# Altium footprint library CeleronLib_THD.PcbLib: 217 footprints (part 6 of 14)
Each footprint in its own frame and in the unit in brackets; x right, y up, seen from the top. Pads: shape width x height; smd on the part's side, far side on the other; paste and mask are expansions set on the pad; w line width, h text height; cw(c..) or ccw(c..) is an arc to the next point about the centre after c.
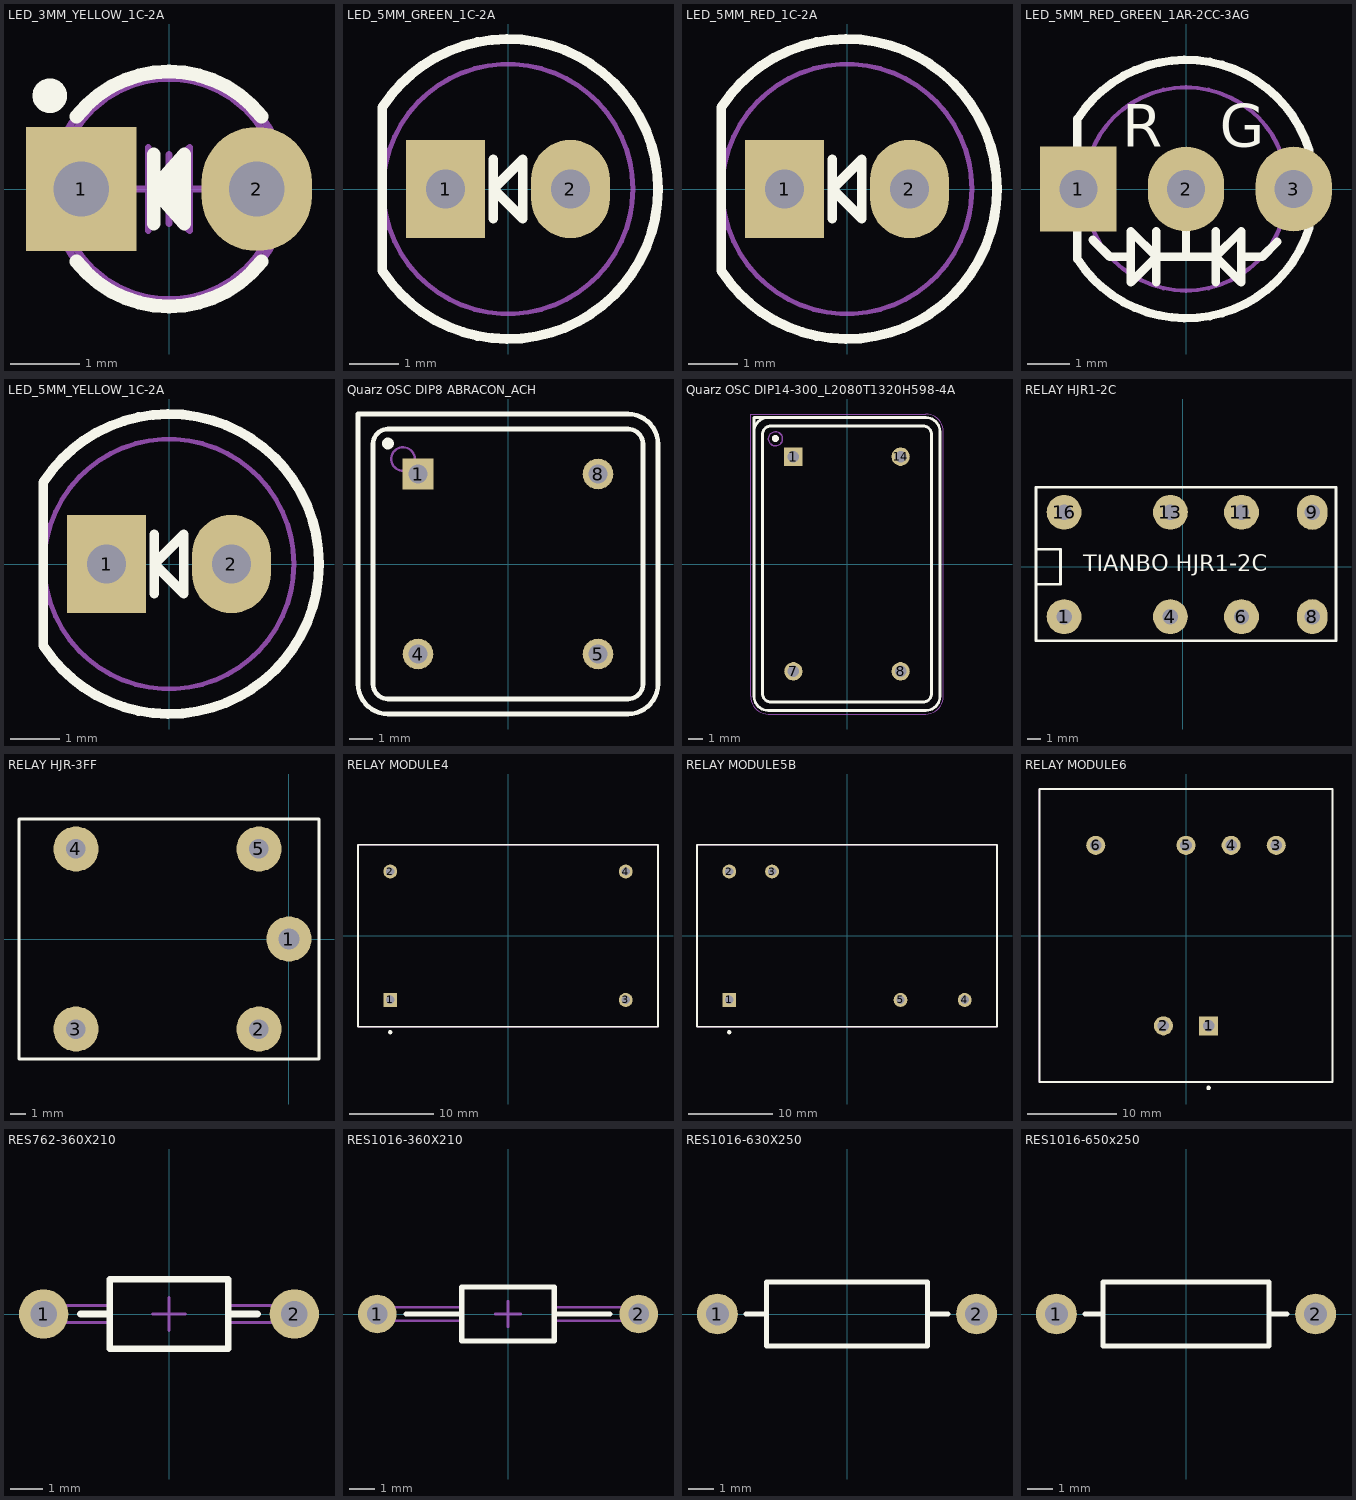
[diagram p5: the footprints below, top view; thin cyan lines are the x and y axes]

## LED_3MM_YELLOW_1C-2A [mm] "LED, Red, Body Dia. 3.43 mm, Pin spacing 2.54mm"
height 6.35
pads (2):
  rect 1.6x1.8 hole 0.8: 1(-1.27,0)
  oval 1.6x1.8 hole 0.8: 2(1.27,0)
Top Overlay:
  circle w0.25: c-1.725,1.35 r0.125
  lines w0.2: -1.339,-1.048 ccw(c0,0) 1.339,-1.048 ; -1.339,1.048 cw(c0,0) 1.339,1.048 ; -0.22,-0.5 -0.22,0.5 ; 0.22,-0.4 -0.22,0 ; 0.22,-0.3 -0.22,0 ; 0.22,-0.2 -0.22,0 ; 0.22,-0.1 -0.22,0 ; 0.22,0 -0.22,0 ; 0.22,0.1 -0.22,0 ; 0.22,0.2 -0.22,0 ; 0.22,0.3 -0.22,0 ; 0.22,0.4 -0.22,0 ; -0.22,0 0.22,-0.5 0.22,0.5 -0.22,0
Mechanical 8:
  lines w0.1: -1.77,0 -1.27,0 ; -1.27,-0.5 -1.27,0 ; -1.27,0.5 -1.27,0 ; -0.77,0 -1.27,0 ; -0.5,0 0,0 ; 0,-0.5 0,0 ; 0,0.5 0,0 ; 0.5,0 0,0 ; 0.77,0 1.27,0 ; 1.27,-0.5 1.27,0 ; 1.27,0.5 1.27,0 ; 1.77,0 1.27,0
Top Assy:
  circle w0.1: c0,0 r1.6
  circle w0.1: c0,0 r1.7
  lines w0.1: -0.3,-0.6 -0.3,0.6 ; 0.3,0 -0.3,0 ; -0.3,0 0.3,-0.6 0.3,0.6 -0.3,0
3D body: height 9.85, standoff -3.5, extent -1.715,-1.715 1.715,1.715

## LED_5MM_GREEN_1C-2A [mm] "LED, Green, Body Dia. 5.08mm, Pin spacing 2.54mm"
height 9.19
pads (2):
  rect 1.6x2 hole 0.8: 1(-1.27,0)
  oval 1.6x2 hole 0.8: 2(1.27,0)
Top Overlay:
  lines w0.2: -0.3,-0.6 -0.3,0.6 ; -2.558,-1.661 ccw(c0,0) -2.558,1.661 -2.558,-1.661 ; -0.3,0 0.3,0.6 0.3,-0.6 -0.3,0
Top Assy:
  circle w0.1: c0,0 r2.54
  lines w0.1: -0.3,-0.6 -0.3,0.6 ; -2.529,-1.706 ccw(c0,0) -2.529,1.706 -2.529,-1.706 ; -0.3,0 0.3,-0.6 0.3,0.6 -0.3,0
3D body: height 14.32, standoff -3.5, extent -2.54,-3.048 3.05,3.048

## LED_5MM_RED_1C-2A [mm] "LED, Red, Body Dia. 5.08mm, Pin spacing 2.54mm"
height 9.19
pads (2):
  rect 1.6x2 hole 0.8: 1(-1.27,0)
  oval 1.6x2 hole 0.8: 2(1.27,0)
Top Overlay:
  lines w0.2: -0.3,-0.6 -0.3,0.6 ; -2.558,-1.661 ccw(c0,0) -2.558,1.661 -2.558,-1.661 ; -0.3,0 0.3,-0.6 0.3,0.6 -0.3,0
Top Assy:
  circle w0.1: c0,0 r2.54
  lines w0.1: -0.3,-0.6 -0.3,0.6 ; -2.529,-1.706 ccw(c0,0) -2.529,1.706 -2.529,-1.706 ; -0.3,0 0.3,0.6 0.3,-0.6 -0.3,0
3D body: height 14.32, standoff -3.5, extent -2.54,-3.048 3.05,3.048

## LED_5MM_RED_GREEN_1AR-2CC-3AG [mm] "Bicolor Red/Green  LED 1 Anode Red 2 Com Cathode 3 Anode Green, Body Dia. 5.08mm, Pin spacing 2.54mm"
height 12.4
pads (3):
  rect 1.8x2 hole 0.9: 1(-2.54,0)
  oval 1.8x2 hole 0.9: 2(0,0) 3(2.54,0)
Top Overlay:
  lines w0.2: -2.563,-1 -2.563,-1.653 ccw(c0,0) 2.913,-0.904 ; -2.563,1 -2.563,1.653 cw(c0,0) 2.913,0.904 ; -2.2,-1.2 -1.8,-1.6 -1.3,-1.6 ; -0.7,-2.2 -0.7,-1 ; 0,-1.6 0,-1 ; 0.7,-2.2 0.7,-1 ; 1.3,-1.6 1.8,-1.6 2.15,-1.25 ; -0.7,-1.6 0.7,-1.6 ; -0.7,-1.6 -1.3,-1 -1.3,-2.2 -0.7,-1.6 ; 0.7,-1.6 1.3,-2.2 1.3,-1 0.7,-1.6
  text "G" at 0.8,1 h1
  text "R" at -1.5,1 h1
Top Assy:
  lines w0.1: -1.8,-1.6 -1.3,-1.6 ; -0.7,-2.2 -0.7,-1 ; 0,-1.6 0,-1 ; 0.7,-2.2 0.7,-1 ; 1.3,-1.6 1.8,-1.6 ; -0.7,-1.6 -1.3,-2.2 -1.3,-1 -0.7,-1.6 ; -0.7,-1.6 0.7,-1.6 ; 0.7,-1.6 1.3,-1 1.3,-2.2 0.7,-1.6 ; -2.563,-1.653 ccw(c0,0) 3.05,0 ccw(c0,0) -2.563,1.653 -2.563,0 -2.563,-1.653 ; -2.4,0 ccw(c0,0) 2.4,0 ccw(c0,0) -2.4,0
3D body: height 12.4, standoff -3.6, extent -2.94,-2.95 2.95,2.95

## LED_5MM_YELLOW_1C-2A [mm] "LED, Yellow, Body Dia. 5.08mm, Pin spacing 2.54mm"
height 9.19
pads (2):
  rect 1.6x2 hole 0.8: 1(-1.27,0)
  oval 1.6x2 hole 0.8: 2(1.27,0)
Top Overlay:
  lines w0.2: -0.3,-0.6 -0.3,0.6 ; -2.558,-1.661 ccw(c0,0) -2.558,1.661 -2.558,-1.661 ; -0.3,0 0.3,-0.6 0.3,0.6 -0.3,0
Top Assy:
  circle w0.1: c0,0 r2.54
  lines w0.1: -0.3,-0.6 -0.3,0.6 ; -2.529,-1.706 ccw(c0,0) -2.529,1.706 -2.529,-1.706 ; -0.3,0 0.3,-0.6 0.3,0.6 -0.3,0
3D body: height 14.32, standoff -3.5, extent -2.54,-3.048 3.05,3.048

## Quarz OSC DIP8 ABRACON_ACH [mm] "Oscillator DIP8, 4 Leads, Pitch 7.62 mm X 7.62mm; Body 12.7mm X 12.7mm"
height 6.39
pads (4):
  rect 1.3x1.3 hole 0.8: 1(-3.81,3.81)
  round 1.3 hole 0.8: 4(-3.81,-3.81) 5(3.81,-3.81) 8(3.81,3.81)
Top Overlay:
  circle w0.25: c-5.081,5.101 r0.125
  lines w0.2: -6.35,-5.08 ccw(c-5.08,-5.08) -5.08,-6.35 5.08,-6.35 ccw(c5.08,-5.08) 6.35,-5.08 6.35,5.08 ccw(c5.08,5.08) 5.08,6.35 -6.35,6.35 -6.35,-5.08 ; -5.715,-5.08 ccw(c-5.08,-5.08) -5.08,-5.715 5.08,-5.715 ccw(c5.08,-5.08) 5.715,-5.08 5.715,5.08 ccw(c5.08,5.08) 5.08,5.715 -5.08,5.715 ccw(c-5.08,5.08) -5.715,5.08 -5.715,-5.08
Top Assy:
  circle w0.1: c-4.445,4.445 r0.5
  lines w0.1: -6.35,-5.08 ccw(c-5.08,-5.08) -5.08,-6.35 5.08,-6.35 ccw(c5.08,-5.08) 6.35,-5.08 6.35,5.08 ccw(c5.08,5.08) 5.08,6.35 -6.35,6.35 -6.35,-5.08 ; -5.715,-5.08 ccw(c-5.08,-5.08) -5.08,-5.715 5.08,-5.715 ccw(c5.08,-5.08) 5.715,-5.08 5.715,5.08 ccw(c5.08,5.08) 5.08,5.715 -5.08,5.715 ccw(c-5.08,5.08) -5.715,5.08 -5.715,-5.08
3D body: height 6.39, standoff -3.6, extent -6.35,-6.35 6.35,6.35

## Quarz OSC DIP14-300_L2080T1320H598-4A [mm] "Oscillator DIP 14 Leads, Row Spacing 7.62 mm; Pitch 2.54mm"
height 5.98
pads (4):
  rect 1.3x1.3 hole 0.8: 1(-3.81,7.62)
  round 1.3 hole 0.8: 7(-3.81,-7.62) 8(3.81,-7.62) 14(3.81,7.62)
Top Overlay:
  circle w0.25: c-5.081,8.911 r0.125
  lines w0.2: -6.6,9.4 cw(c-5.6,9.4) -5.6,10.4 ; -6.6,-9.4 ccw(c-5.6,-9.4) -5.6,-10.4 5.6,-10.4 ccw(c5.6,-9.4) 6.6,-9.4 6.6,9.4 ccw(c5.6,9.4) 5.6,10.4 -6.6,10.4 -6.6,-9.4 ; -6,-9.2 ccw(c-5.4,-9.2) -5.4,-9.8 5.4,-9.8 ccw(c5.4,-9.2) 6,-9.2 6,9.2 ccw(c5.4,9.2) 5.4,9.8 -5.4,9.8 ccw(c-5.4,9.2) -6,9.2 -6,-9.2
Top Assy:
  circle w0.1: c-5.08,8.89 r0.5
  lines w0.1: -6.6,9.4 cw(c-5.6,9.4) -5.6,10.4 ; -6.6,-9.4 ccw(c-5.6,-9.4) -5.6,-10.4 5.6,-10.4 ccw(c5.6,-9.4) 6.6,-9.4 6.6,9.4 ccw(c5.6,9.4) 5.6,10.4 -6.6,10.4 -6.6,-9.4 ; -6,-9.2 ccw(c-5.4,-9.2) -5.4,-9.8 5.4,-9.8 ccw(c5.4,-9.2) 6,-9.2 6,9.2 ccw(c5.4,9.2) 5.4,9.8 -5.4,9.8 ccw(c-5.4,9.2) -6,9.2 -6,-9.2
Top Courtyard:
  lines w0.05: -6.85,-9.4 ccw(c-5.6,-9.4) -5.6,-10.65 5.6,-10.65 ccw(c5.6,-9.4) 6.85,-9.4 6.85,9.4 ccw(c5.6,9.4) 5.6,10.65 -6.85,10.65 -6.85,-9.4
3D body: height 5.98, standoff -3.6, extent -6.6,-10.4 6.6,10.4

## RELAY HJR1-2C [mm] "Реле тип HJR1-2C. Две пары на замыкание, две пары на размыкание"
height 11.8
pads (8):
  round 2.5 hole 1.1: 1(-8.487,-3.575) 4(-0.869,-3.575) 6(4.225,-3.572) 11(4.225,3.91) 13(-0.867,3.91) 16(-8.486,3.911)
  oval 2.2x2.5 hole 1.1: 8(9.3,-3.575) 9(9.3,3.9)
Top Overlay:
  lines w0.2: -10.5,-1.25 -8.75,-1.25 -8.75,1.25 -10.5,1.25 ; -10.5,-5.3 11,-5.3 11,5.7 -10.5,5.7 -10.5,-5.3
  text "TIANBO HJR1-2C" at -7.1,-0.7 h2

## RELAY HJR-3FF [mm] "Реле тип HJR-3FF"
height 19.2
pads (5):
  round 3 hole 1.4: 1(0,0)
  round 3 hole 1.3: 2(-2,-6) 3(-14.2,-6) 4(-14.2,6) 5(-2,6)
Top Overlay:
  lines w0.2: -18,-8 2,-8 2,8 -18,8 -18,-8

## RELAY MODULE4 [mm] "DIP; 4 Round Pins; Row Space 27.94 mm; Pitch 15.24 mm"
height 14
pads (4):
  rect 1.65x1.65 hole 1: 1(-13.97,-7.62)
  round 1.65 hole 1: 2(-13.97,7.62) 3(13.97,-7.62) 4(13.97,7.62)
Top Overlay:
  circle w0.25: c-13.97,-11.45 r0.125
  lines w0.2: -17.8,-10.8 -17.8,10.8 17.8,10.8 17.8,-10.8 -17.8,-10.8
Top 3D:
  lines w0.1: -17.8,-10.8 -17.8,10.8 17.8,10.8 17.8,-10.8 -17.8,-10.8
3D body: height 14, standoff 0, extent -17.8,-10.8 17.8,10.8

## RELAY MODULE5B [mm] "DIP; 5 Round Pins; Row Space 15.24 mm; Pitch 2.54 mm"
height 14
pads (5):
  rect 1.65x1.65 hole 1: 1(-13.97,-7.62)
  round 1.65 hole 1: 2(-13.97,7.62) 3(-8.89,7.62) 4(13.97,-7.62) 5(6.35,-7.62)
Top Overlay:
  circle w0.25: c-13.97,-11.45 r0.125
  lines w0.2: -17.8,-10.8 17.8,-10.8 17.8,10.8 -17.8,10.8 -17.8,-10.8
Top 3D:
  lines w0.1: -17.8,-10.8 -17.8,10.8 17.8,10.8 17.8,-10.8 -17.8,-10.8
3D body: height 14, standoff 0, extent -17.8,-10.8 17.8,10.8

## RELAY MODULE6 [mm] "DIP; 6 Round Pins; Row Space 20.32 mm; Pitch 2.54 mm"
height 16.5
pads (6):
  rect 2.15x2.15 hole 1.3: 1(2.54,-10.16)
  round 2.15 hole 1.3: 2(-2.54,-10.16) 3(10.16,10.16) 4(5.08,10.16) 5(0,10.16) 6(-10.16,10.16)
Top Overlay:
  circle w0.25: c2.54,-17.15 r0.125
  lines w0.2: -16.5,-16.5 -16.5,16.5 16.5,16.5 16.5,-16.5 -16.5,-16.5
Top 3D:
  lines w0.1: -16.5,-16.5 -16.5,16.5 16.5,16.5 16.5,-16.5 -16.5,-16.5
3D body: height 16.5, standoff 0, extent -16.5,-16.5 16.5,16.5

## RES762-360X210 [mm] "Resistor, Axial, Pad spacing 7.62mm - Body Lengh 3.6mm X Body Diameter 2.1mm"
height 2.1
pads (2):
  round 1.5 hole 0.8: 1(-3.81,0) 2(3.81,0)
Top Overlay:
  lines w0.2: -2.69,0 -1.8,0 ; 1.8,0 2.69,0 ; -1.8,-1.05 -1.8,1.05 1.8,1.05 1.8,-1.05 -1.8,-1.05
Mechanical 8:
  lines w0.1: -4.31,0 -3.81,0 ; -3.81,-0.5 -3.81,0 ; -3.81,0.5 -3.81,0 ; -3.31,0 -3.81,0 ; -0.5,0 0,0 ; 0,-0.5 0,0 ; 0,0.5 0,0 ; 0.5,0 0,0 ; 3.31,0 3.81,0 ; 3.81,-0.5 3.81,0 ; 3.81,0.5 3.81,0 ; 4.31,0 3.81,0
Top Assy:
  lines w0.1: -1.8,-0.26 -3.81,-0.26 cw(c-3.81,0) -3.81,0.26 -1.8,0.26 ; 1.8,-0.26 3.81,-0.26 ccw(c3.81,0) 3.81,0.26 1.8,0.26 ; -1.8,-1.05 -1.8,1.05 1.8,1.05 1.8,-1.05 -1.8,-1.05
3D body: height 2.1, standoff -3.6, extent -4.07,-1.05 4.07,1.05

## RES1016-360X210 [mm] "Resistor, Axial, Pad spacing 10.16 mm - Body Lengh 3.6mm X Body Diameter 2.1mm"
height 2.1
pads (2):
  round 1.5 hole 0.8: 1(-5.08,0) 2(5.08,0)
Top Overlay:
  lines w0.2: -3.96,0 -1.8,0 ; 1.8,0 3.96,0 ; -1.8,-1.05 -1.8,1.05 1.8,1.05 1.8,-1.05 -1.8,-1.05
Mechanical 8:
  lines w0.1: -5.58,0 -5.08,0 ; -5.08,-0.5 -5.08,0 ; -5.08,0.5 -5.08,0 ; -4.58,0 -5.08,0 ; -0.5,0 0,0 ; 0,-0.5 0,0 ; 0,0.5 0,0 ; 0.5,0 0,0 ; 4.58,0 5.08,0 ; 5.08,-0.5 5.08,0 ; 5.08,0.5 5.08,0 ; 5.58,0 5.08,0
Top Assy:
  lines w0.1: -1.8,-0.26 -5.08,-0.26 cw(c-5.08,0) -5.08,0.26 -1.8,0.26 ; 1.8,-0.26 5.08,-0.26 ccw(c5.08,0) 5.08,0.26 1.8,0.26 ; -1.8,-1.05 -1.8,1.05 1.8,1.05 1.8,-1.05 -1.8,-1.05
3D body: height 2.1, standoff -3.6, extent -5.34,-1.05 5.34,1.05

## RES1016-630X250 [mm] "Resistor, Axial, Pad spacing 10.16 mm - Body Lengh 6.3mm X Body Diameter 2.5mm"
height 2.5
pads (2):
  round 1.6 hole 0.9: 1(-5.08,0) 2(5.08,0)
Top Overlay:
  lines w0.2: -3.95,0 -3.15,0 ; 3.15,0 3.95,0 ; -3.15,-1.25 3.15,-1.25 3.15,1.25 -3.15,1.25 -3.15,-1.25
Top Assy:
  lines w0.1: -3.95,0 -3.15,0 ; 3.15,0 3.95,0 ; -3.15,-1.25 -3.15,1.25 3.15,1.25 3.15,-1.25 -3.15,-1.25
3D body: height 2.51, standoff -3.2, extent -5.38,-1.27 5.38,1.26

## RES1016-650x250 [mm] "Resistor, Axial, Pad spacing 10.16 mm - Body Lengh 6.5mm X Body Diameter 2.5mm"
height 2.5
pads (2):
  round 1.6 hole 0.9: 1(-5.08,0) 2(5.08,0)
Top Overlay:
  lines w0.2: -3.95,0 -3.25,0 ; 3.25,0 3.95,0 ; -3.25,-1.25 3.25,-1.25 3.25,1.25 -3.25,1.25 -3.25,-1.25
Top Assy:
  lines w0.1: -3.95,0 -3.25,0 ; 3.25,0 3.95,0 ; -3.25,-1.25 -3.25,1.25 3.25,1.25 3.25,-1.25 -3.25,-1.25
3D body: height 2.51, standoff -3.2, extent -5.38,-1.27 5.38,1.26